# Altium footprint library SG_PCB_HOLE_Connector.PcbLib: 133 footprints (part 2 of 9)
Each footprint in its own frame and in the unit in brackets; x right, y up, seen from the top. Pads: shape width x height; smd on the part's side, far side on the other; paste and mask are expansions set on the pad; w line width, h text height; cw(c..) or ccw(c..) is an arc to the next point about the centre after c.
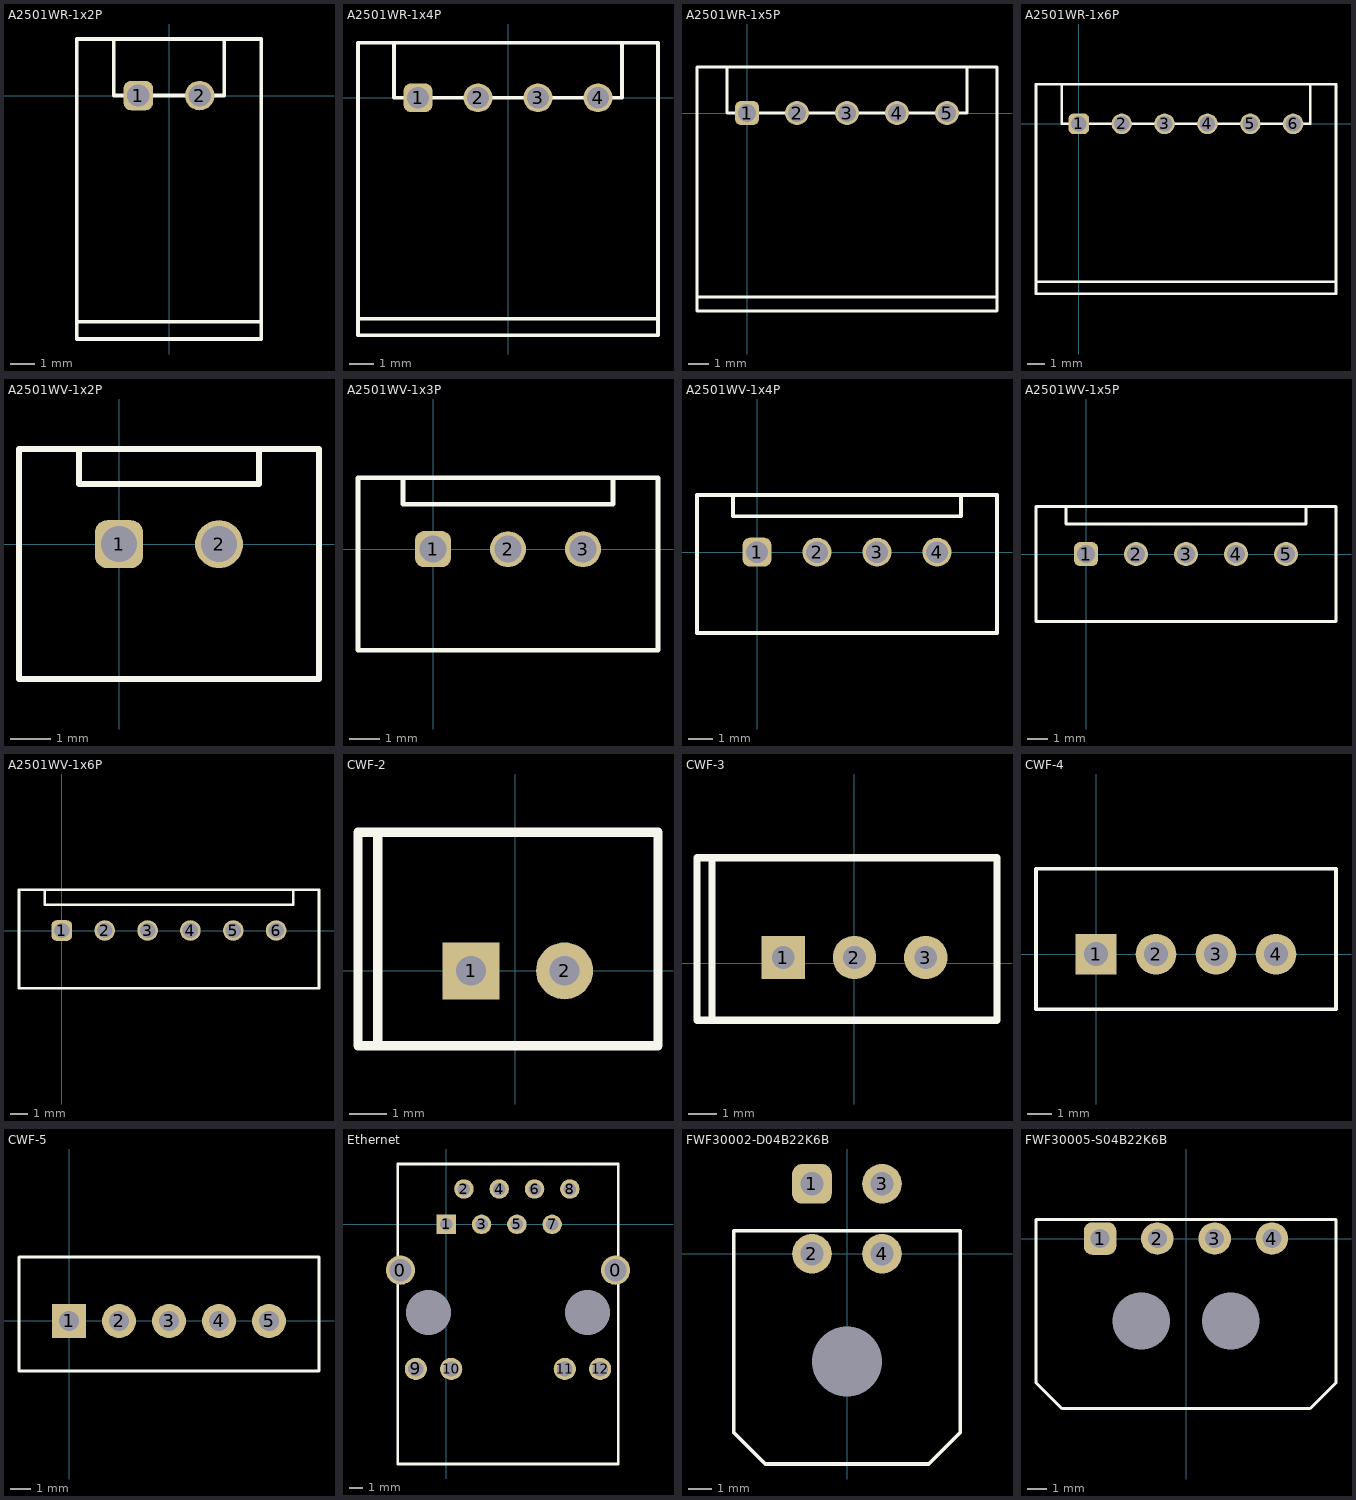
[diagram p1: the footprints below, top view; thin cyan lines are the x and y axes]

## A2501WR-1x2P [mm] "PLD-2-2.5"
pads (2):
  rrect50% 1.2x1.2 / inner rrect50% 1.5x1.5 / far side rrect50% 1.8x1.8 hole 0.9: 1(-1.25,0)
  round 1.2 / inner round 1.5 / far side round 1.8 hole 0.9: 2(1.25,0)
Top Overlay:
  lines w0.152: -3.75,-9.2 3.75,-9.2 ; -2.25,2.3 -2.25,0 2.25,0 2.25,2.3 ; -3.75,-9.9 -3.75,0.5 -3.75,2.3 3.75,2.3 3.75,-1 3.75,-9.9 -3.75,-9.9
3D body: height 5.75, standoff 0, extent -3.75,-9.9 3.75,2.3

## A2501WR-1x4P [mm] "PLD-2-2.5"
pads (4):
  rrect50% 1.2x1.2 / inner rrect50% 1.5x1.5 / far side rrect50% 1.8x1.8 hole 0.9: 1(-3.75,0)
  round 1.2 / inner round 1.5 / far side round 1.8 hole 0.9: 2(-1.25,0) 3(1.25,0) 4(3.75,0)
Top Overlay:
  lines w0.152: -6.25,-9.2 6.25,-9.2 ; -4.75,2.3 -4.75,0 4.75,0 4.75,2.3 ; -6.25,-9.9 6.25,-9.9 6.25,-1 6.25,2.3 -6.25,2.3 -6.25,0.5 -6.25,-9.9
3D body: height 5.75, standoff 0, extent -6.25,-9.9 6.25,2.3

## A2501WR-1x5P [mm] "PLD-2-2.5"
pads (5):
  rrect50% 1.2x1.2 / inner rrect50% 1.5x1.5 / far side rrect50% 1.8x1.8 hole 0.9: 1(0,0)
  round 1.2 / inner round 1.5 / far side round 1.8 hole 0.9: 2(2.5,0) 3(5,0) 4(7.5,0) 5(10,0)
Top Overlay:
  lines w0.152: -2.5,-9.2 12.5,-9.2 ; -1,2.3 -1,0 11,0 11,2.3 ; -2.5,-9.9 -2.5,0.5 -2.5,2.3 12.5,2.3 12.5,-3.5 12.5,-9.9 -2.5,-9.9
3D body: height 5.75, standoff 0, extent -2.5,-9.9 12.5,2.3

## A2501WR-1x6P [mm] "PLD-6-2.5"
pads (6):
  rrect50% 1.2x1.2 / inner rrect50% 1.5x1.5 / far side rrect50% 1.8x1.8 hole 0.9: 1(0,0)
  round 1.2 / inner round 1.5 / far side round 1.8 hole 0.9: 2(2.5,0) 3(5,0) 4(7.5,0) 5(10,0) 6(12.5,0)
Top Overlay:
  lines w0.152: -2.5,-9.2 15,-9.2 ; -1,2.3 -1,0 13.5,0 13.5,2.3 ; -2.5,-9.9 15,-9.9 15,-6 15,2.3 -2.5,2.3 -2.5,0.5 -2.5,-9.9
3D body: height 5.75, standoff 0, extent -2.5,-9.9 15,2.3

## A2501WV-1x2P [mm] "PLD-2-2.5"
pads (2):
  rrect50% 1.2x1.2 / inner rrect50% 1.5x1.5 / far side rrect50% 1.8x1.8 hole 0.9: 1(0,0)
  round 1.2 / inner round 1.5 / far side round 1.8 hole 0.9: 2(2.5,0)
Top Overlay:
  lines w0.152: -1,2.38 -1,1.5 3.5,1.5 3.5,2.3 ; -2.5,-3.37 5,-3.37 5,2.38 -2.5,2.38 -2.5,0.5 -2.5,-3.37
3D body: height 7, standoff 0, extent -2.5,-3.37 5,2.38

## A2501WV-1x3P [mm] "PLD-2-2.5"
pads (3):
  rrect50% 1.2x1.2 / inner rrect50% 1.5x1.5 / far side rrect50% 1.8x1.8 hole 0.9: 1(0,0)
  round 1.2 / inner round 1.5 / far side round 1.8 hole 0.9: 2(2.5,0) 3(5,0)
Top Overlay:
  lines w0.152: -1,2.38 -1,1.5 6,1.5 6,2.3 ; -2.5,-3.37 7.5,-3.37 7.5,0.5 7.5,2.38 -2.5,2.38 -2.5,0.5 -2.5,-3.37
3D body: height 7, standoff 0, extent -2.5,-3.37 7.5,2.38

## A2501WV-1x4P [mm] "PLD-2-2.5"
pads (4):
  rrect50% 1.2x1.2 / inner rrect50% 1.5x1.5 / far side rrect50% 1.8x1.8 hole 0.9: 1(0,0)
  round 1.2 / inner round 1.5 / far side round 1.8 hole 0.9: 2(2.5,0) 3(5,0) 4(7.5,0)
Top Overlay:
  lines w0.152: -1,2.38 -1,1.5 8.5,1.5 8.5,2.3 ; -2.5,-3.37 -2.5,0.5 -2.5,2.38 10,2.38 10,-2 10,-3.37 -2.5,-3.37
3D body: height 7, standoff 0, extent -2.5,-3.37 10,2.38

## A2501WV-1x5P [mm] "PLD-2-2.5"
pads (5):
  rrect50% 1.2x1.2 / inner rrect50% 1.5x1.5 / far side rrect50% 1.8x1.8 hole 0.9: 1(0,0)
  round 1.2 / inner round 1.5 / far side round 1.8 hole 0.9: 2(2.5,0) 3(5,0) 4(7.5,0) 5(10,0)
Top Overlay:
  lines w0.152: -1,2.38 -1,1.5 11,1.5 11,2.3 ; -2.5,-3.37 -2.5,0.5 -2.5,2.38 12.5,2.38 12.5,0.5 12.5,-3.37 -2.5,-3.37
3D body: height 7, standoff 0, extent -2.5,-3.37 12.5,2.38

## A2501WV-1x6P [mm] "PLD-6-2.5"
pads (6):
  rrect50% 1.2x1.2 / inner rrect50% 1.5x1.5 / far side rrect50% 1.8x1.8 hole 0.9: 1(0,0)
  round 1.2 / inner round 1.5 / far side round 1.8 hole 0.9: 2(2.5,0) 3(5,0) 4(7.5,0) 5(10,0) 6(12.5,0)
Top Overlay:
  lines w0.152: -1,2.38 -1,1.5 13.5,1.5 13.5,2.3 ; -2.5,-3.37 -2.5,0.5 -2.5,2.38 15,2.38 15,1 15,-3.37 -2.5,-3.37
3D body: height 7, standoff 0, extent -2.5,-3.37 15,2.38

## CWF-2 [mm]
pads (2):
  rect 1.524x1.524 hole 0.8: 1(-1.175,0)
  round 1.524 hole 0.8: 2(1.325,0)
Top Overlay:
  lines w0.254: -3.675,-2 -4.2,-2 -4.2,3.7 -3.675,3.7 ; -3.675,-2 -3.675,3.7 ; -3.675,-2 3.825,-2 3.825,3.7 -3.675,3.7
3D body "CWF2.stp": height 7.7, standoff -1.5, extent -3.675,-2.1 3.825,3.6

## CWF-3 [mm]
pads (3):
  rect 1.524x1.524 hole 0.8: 1(-2.5,0.2)
  round 1.524 hole 0.8: 2(0,0.2) 3(2.5,0.2)
Top Overlay:
  lines w0.254: -5,-2 -5.525,-2 -5.525,3.7 -5,3.7 ; -5,-2 -5,3.7 ; -5,-2 5,-2 5,3.7 -5,3.7
3D body "CWF3.stp": height 7.7, standoff -1.5, extent -4.9,-2.05 5.1,3.65

## CWF-4 [mm]
pads (4):
  rect 1.7x1.7 hole 1 mask+0.05: 1(-0.007,0)
  round 1.7 hole 1 mask+0.05: 2(2.493,0) 3(4.993,0) 4(7.493,0)
Top Overlay:
  lines w0.15: -2.507,-2.286 -2.507,3.556 9.993,3.556 9.993,-2.286 -2.507,-2.286
3D body "CWF-4.step": height 6.5, standoff -4, extent -2.39,-2.194 10.01,3.556

## CWF-5 [mm]
pads (5):
  rect 1.7x1.7 hole 1 mask+0.05: 1(0,0)
  round 1.7 hole 1 mask+0.05: 2(2.5,0) 3(5,0) 4(7.5,0) 5(10,0)
Top Overlay:
  lines w0.15: -2.5,-2.5 -2.5,3.2 12.5,3.2 12.5,-2.5 -2.5,-2.5

## Ethernet [mm]
pads (16):
  round 2.1 hole 1.6: 0(-3.305,-3.3) 0(12.185,-3.3)
  round 0 hole 3.25: 0(-1.275,-6.35) 0(10.155,-6.35)
  rect 1.4x1.4 hole 0.9: 1(0,0)
  round 1.4 hole 0.9: 2(1.27,2.54) 3(2.54,0) 4(3.81,2.54) 5(5.08,0) 6(6.35,2.54) 7(7.62,0) 8(8.89,2.54)
  round 1.6 hole 1.1: 9(-2.19,-10.41) 10(0.35,-10.41) 11(8.53,-10.41) 12(11.07,-10.41)
Top Overlay:
  lines w0.2: -3.5,-17.25 4.44,-17.25 12.38,-17.25 12.38,4.34 4.44,4.34 -3.5,4.34 -3.5,-17.25

## FWF30002-D04B22K6B [mm]
pads (5):
  rrect50% 1.7x1.7 hole 1: 1(-1.5,3)
  round 1.7 hole 1: 2(-1.5,0) 3(1.5,3) 4(1.5,0)
  round 1.5 hole 3 unplated: ""(0,-4.6)
Top Overlay:
  lines w0.152: -4.85,-7.65 -3.5,-9 3.5,-9 4.85,-7.65 4.85,1 0,1 -4.85,1 -4.85,-7.65
3D body: height 7.37, standoff 0, extent -4.85,-9 4.85,1
3D body: height 3.3, standoff -3.2, extent 0.744,-5.85 1.958,-3.35
3D body: height 3.3, standoff -3.2, extent -1.928,-5.85 -0.714,-3.35

## FWF30005-S04B22K6B [mm]
pads (6):
  rrect50% 1.7x1.7 hole 1: 1(-4.5,0)
  round 1.7 hole 1: 2(-1.5,0) 3(1.5,0) 4(4.5,0)
  round 1.5 hole 3 unplated: ""(-2.35,-4.32) ""(2.35,-4.32)
Top Overlay:
  lines w0.152: -7.85,-7.55 -7.85,1 0,1 7.85,1 7.85,-7.55 6.5,-8.9 -6.5,-8.9 -7.85,-7.55
3D body: height 3.3, standoff -3.2, extent 3.1,-5.56 4.314,-3.06
3D body: height 3.3, standoff -3.2, extent -4.314,-5.56 -3.1,-3.06
3D body: height 4.37, standoff 0, extent -7.85,-8.9 7.85,1